# Altium schematic symbol library FPGA_Xilinx_Virtex7.SchLib: 34 symbols (part 4 of 26) (continued)
## XC7V2000T-FLG1925 (continued)
part J pins: AA2 IO_L18N_T2_37, AA3 IO_L18P_T2_37, AA4 IO_L17N_T2_37, AA5 IO_L17P_T2_37, AA6 VCCO_37, AA7 IO_L22N_T3_37, AA8 IO_L22P_T3_37, AA9 IO_L20N_T3_37, AA10 IO_L20P_T3_37, J1 IO_L9N_T1_DQS_38, J2 VCCO_38, J3 IO_L10N_T1_38, J4 IO_L8N_T1_38, J5 IO_L8P_T1_38, K1 IO_L9P_T1_DQS_38, K2 IO_L7N_T1_38, K3 IO_L10P_T1_38, K5 IO_L4N_T0_38, K6 IO_L2N_T0_38, K7 IO_L2P_T0_38, K8 IO_L1N_T0_38, L2 IO_L7P_T1_38, L3 IO_L12N_T1_MRCC_38, L4 IO_L12P_T1_MRCC_38, L5 IO_L4P_T0_38, L6 VCCO_38, L7 IO_L6N_T0_VREF_38, L8 IO_L6P_T0_38, L9 IO_L1P_T0_38, L10 IO_0_VRN_38, M1 IO_L15N_T2_DQS_38, M2 IO_L15P_T2_DQS_38, M3 VCCO_38, M4 IO_L11N_T1_SRCC_38, M5 IO_L11P_T1_SRCC_38, M6 IO_L3N_T0_DQS_38, M7 IO_L3P_T0_DQS_38, M9 IO_L5N_T0_38, M10 IO_L5P_T0_38, N1 IO_L17N_T2_38, N2 IO_L17P_T2_38, N3 IO_L13N_T2_MRCC_38, N4 IO_L13P_T2_MRCC_38, N6 IO_L20N_T3_38, N7 IO_L21N_T3_DQS_38, N8 IO_L19N_T3_VREF_38, N9 IO_L19P_T3_38, N10 VCCO_38, P1 IO_L16N_T2_38, P3 IO_L14N_T2_SRCC_38, P4 IO_L14P_T2_SRCC_38, P5 IO_L22N_T3_38, P6 IO_L20P_T3_38, P7 VCCO_38, P8 IO_L21P_T3_DQS_38, P9 IO_L23N_T3_38, P10 IO_L23P_T3_38, R1 IO_L16P_T2_38, R2 IO_L18N_T2_38, R3 IO_L18P_T2_38, R4 VCCO_38, R5 IO_L22P_T3_38, R6 IO_L24N_T3_38, R7 IO_L24P_T3_38, R8 IO_L2N_T0_37, R10 IO_25_VRP_38, T1 VCCO_37, T2 IO_L10N_T1_37, T3 IO_L10P_T1_37, T4 IO_L8N_T1_37, T5 IO_L8P_T1_37, T7 IO_L4N_T0_37, T8 IO_L4P_T0_37, T9 IO_L2P_T0_37, T10 IO_0_VRN_37, U1 IO_L7N_T1_37, U2 IO_L7P_T1_37, U4 IO_L12N_T1_MRCC_37, U5 IO_L12P_T1_MRCC_37, U6 IO_L1N_T0_37, U7 IO_L1P_T0_37, U8 VCCO_37, U9 IO_L6N_T0_VREF_37, U10 IO_L6P_T0_37, V1 IO_L9N_T1_DQS_37, V2 IO_L9P_T1_DQS_37, V3 IO_L11N_T1_SRCC_37, V4 IO_L11P_T1_SRCC_37, V5 VCCO_37, V6 IO_L21N_T3_DQS_37, V7 IO_L3N_T0_DQS_37, V8 IO_L3P_T0_DQS_37, V9 IO_L5N_T0_37, V10 IO_L5P_T0_37, W1 IO_L16N_T2_37, W2 VCCO_37, W3 IO_L13N_T2_MRCC_37, W4 IO_L13P_T2_MRCC_37, W5 IO_L14N_T2_SRCC_37, W6 IO_L21P_T3_DQS_37, W8 IO_L23N_T3_37, W9 IO_L19N_T3_VREF_37, W10 IO_L19P_T3_37, Y1 IO_L16P_T2_37, Y2 IO_L15N_T2_DQS_37, Y3 IO_L15P_T2_DQS_37, Y5 IO_L14P_T2_SRCC_37, Y6 IO_L24N_T3_37, Y7 IO_L24P_T3_37, Y8 IO_L23P_T3_37, Y9 VCCO_37, Y10 IO_25_VRP_37
part K pins: A3 IO_L18N_T2_39, A4 IO_L16N_T2_39, A5 IO_L16P_T2_39, A6 VCCO_39, A7 IO_L10N_T1_39, A18 IO_L7N_T1_40, A19 IO_L7P_T1_40, A20 IO_L8N_T1_40, B2 IO_L15N_T2_DQS_39, B3 VCCO_39, B4 IO_L18P_T2_39, B5 IO_L9N_T1_DQS_39, B6 IO_L9P_T1_DQS_39, B7 IO_L10P_T1_39, B19 IO_L9N_T1_DQS_40, B20 IO_L8P_T1_40, B21 IO_L10N_T1_40, C1 IO_L17N_T2_39, C2 IO_L15P_T2_DQS_39, C3 IO_L13N_T2_MRCC_39, C4 IO_L14N_T2_SRCC_39, C6 IO_L7N_T1_39, C7 IO_L7P_T1_39, C8 IO_L8N_T1_39, C18 IO_L11N_T1_SRCC_40, C19 IO_L9P_T1_DQS_40, C20 VCCO_40, C21 IO_L10P_T1_40, D1 IO_L17P_T2_39, D3 IO_L13P_T2_MRCC_39, D4 IO_L14P_T2_SRCC_39, D5 IO_L11N_T1_SRCC_39, D6 IO_L12N_T1_MRCC_39, D7 VCCO_39, D8 IO_L8P_T1_39, D18 IO_L11P_T1_SRCC_40, D19 IO_L12N_T1_MRCC_40, D20 IO_L12P_T1_MRCC_40, D21 IO_L15N_T2_DQS_40, E1 IO_L23N_T3_39, E2 IO_L23P_T3_39, E3 IO_L21N_T3_DQS_39, E4 VCCO_39, E5 IO_L11P_T1_SRCC_39, E6 IO_L12P_T1_MRCC_39, E7 IO_L3N_T0_DQS_39, E8 IO_L1N_T0_39, E18 IO_L18N_T2_40, E20 IO_L14N_T2_SRCC_40, E21 IO_L15P_T2_DQS_40, F1 VCCO_39, F2 IO_L22N_T3_39, F3 IO_L21P_T3_DQS_39, F4 IO_L19N_T3_VREF_39, F5 IO_L5N_T0_39, F7 IO_L3P_T0_DQS_39, F8 IO_L1P_T0_39, F18 IO_L18P_T2_40, F19 IO_L13N_T2_MRCC_40, F20 IO_L14P_T2_SRCC_40, F21 VCCO_40, G1 IO_L24N_T3_39, G2 IO_L22P_T3_39, G4 IO_L19P_T3_39, G5 IO_L5P_T0_39, G6 IO_L4N_T0_39, G7 IO_L4P_T0_39, G8 VCCO_39, G18 VCCO_40, G19 IO_L13P_T2_MRCC_40, G20 IO_L17N_T2_40, G21 IO_L17P_T2_40, H1 IO_L24P_T3_39, H2 IO_L20N_T3_39, H3 IO_L20P_T3_39, H4 IO_25_VRP_39, H5 VCCO_39, H6 IO_L6N_T0_VREF_39, H7 IO_L2N_T0_39, H8 IO_L2P_T0_39, H18 IO_L3N_T0_DQS_40, H19 IO_L5N_T0_40, J6 IO_L6P_T0_39, J8 IO_0_VRN_39, J18 IO_L3P_T0_DQS_40, J19 IO_L5P_T0_40, J20 IO_L16N_T2_40, K17 IO_L1N_T0_40, K18 IO_L2N_T0_40, K19 VCCO_40, K20 IO_L16P_T2_40, L17 IO_L1P_T0_40, L18 IO_L2P_T0_40, L19 IO_L6N_T0_VREF_40, L20 IO_L4N_T0_40, M17 IO_0_VRN_40, M19 IO_L6P_T0_40, M20 IO_L4P_T0_40, N17 IO_25_VRP_40, N18 IO_L24N_T3_40, N19 IO_L19N_T3_VREF_40, N20 VCCO_40, P17 VCCO_40, P18 IO_L24P_T3_40, P19 IO_L19P_T3_40, P20 IO_L20N_T3_40, R17 IO_L23N_T3_40, R18 IO_L22N_T3_40, R20 IO_L20P_T3_40, T17 IO_L23P_T3_40, T18 IO_L22P_T3_40, T19 IO_L21N_T3_DQS_40, T20 IO_L21P_T3_DQS_40
part L pins: A8 IO_L7N_T1_42, A9 IO_L10N_T1_42, A10 IO_L10P_T1_42, A12 IO_L8N_T1_42, A13 IO_L8N_T1_41, A14 IO_L10N_T1_41, A15 IO_L10P_T1_41, A16 VCCO_41, A17 IO_L17N_T2_41, B9 IO_L7P_T1_42, B10 IO_L9N_T1_DQS_42, B11 IO_L9P_T1_DQS_42, B12 IO_L8P_T1_42, B13 VCCO_41, B14 IO_L8P_T1_41, B15 IO_L16N_T2_41, B16 IO_L16P_T2_41, B17 IO_L17P_T2_41, C9 IO_L12N_T1_MRCC_42, C10 VCCO_42, C11 IO_L11N_T1_SRCC_42, C12 IO_L11P_T1_SRCC_42, C13 IO_L11N_T1_SRCC_41, C14 IO_L11P_T1_SRCC_41, C16 IO_L18N_T2_41, C17 IO_L18P_T2_41, D9 IO_L12P_T1_MRCC_42, D10 IO_L14N_T2_SRCC_42, D11 IO_L13N_T2_MRCC_42, D13 IO_L9N_T1_DQS_41, D14 IO_L12N_T1_MRCC_41, D15 IO_L12P_T1_MRCC_41, D16 IO_L14N_T2_SRCC_41, D17 VCCO_41, E10 IO_L14P_T2_SRCC_42, E11 IO_L13P_T2_MRCC_42, E12 IO_L15N_T2_DQS_42, E13 IO_L9P_T1_DQS_41, E14 VCCO_41, E15 IO_L13N_T2_MRCC_41, E16 IO_L14P_T2_SRCC_41, E17 IO_L15N_T2_DQS_41, F9 IO_L22N_T3_42, F10 IO_L16N_T2_42, F11 VCCO_42, F12 IO_L15P_T2_DQS_42, F13 IO_L7N_T1_41, F14 IO_L7P_T1_41, F15 IO_L13P_T2_MRCC_41, F17 IO_L15P_T2_DQS_41, G9 IO_L22P_T3_42, G10 IO_L16P_T2_42, G11 IO_L18N_T2_42, G12 IO_L17N_T2_42, G14 IO_L4N_T0_41, G15 IO_L4P_T0_41, G16 IO_L3N_T0_DQS_41, G17 IO_L6N_T0_VREF_41, H9 IO_L24N_T3_42, H11 IO_L18P_T2_42, H12 IO_L17P_T2_42, H13 IO_L19N_T3_VREF_42, H14 IO_L2N_T0_41, H15 VCCO_41, H16 IO_L3P_T0_DQS_41, H17 IO_L6P_T0_41, J9 IO_L24P_T3_42, J10 IO_L20N_T3_42, J11 IO_L23N_T3_42, J12 VCCO_42, J13 IO_L19P_T3_42, J14 IO_L2P_T0_41, J15 IO_L1N_T0_41, J16 IO_L5N_T0_41, K9 VCCO_42, K10 IO_L20P_T3_42, K11 IO_L23P_T3_42, K12 IO_L21N_T3_DQS_42, K13 IO_25_VRP_42, K15 IO_L1P_T0_41, K16 IO_L5P_T0_41, L12 IO_L21P_T3_DQS_42, L13 IO_0_VRN_42, L14 IO_L20N_T3_41, L15 IO_0_VRN_41, L16 VCCO_41, M11 IO_L3N_T0_DQS_42, M12 IO_L5N_T0_42, M13 VCCO_42, M14 IO_L24N_T3_41, M15 IO_L20P_T3_41, M16 IO_L21N_T3_DQS_41, N11 IO_L3P_T0_DQS_42, N12 IO_L5P_T0_42, N13 IO_L1N_T0_42, N14 IO_L24P_T3_41, N16 IO_L21P_T3_DQS_41, P11 IO_L6N_T0_VREF_42, P13 IO_L1P_T0_42, P14 IO_L22N_T3_41, P15 IO_L22P_T3_41, P16 IO_L19N_T3_VREF_41, R11 IO_L6P_T0_42, R12 IO_L4N_T0_42, R13 IO_L2N_T0_42, R14 VCCO_41, R15 IO_L23N_T3_41, R16 IO_L19P_T3_41, T11 VCCO_42, T12 IO_L4P_T0_42, T13 IO_L2P_T0_42, T14 IO_25_VRP_41, T15 IO_L23P_T3_41
part M pins: AP1 MGTXTXN3_113, AP2 MGTXTXP3_113, AP5 MGTXRXN3_113, AP6 MGTXRXP3_113, AR3 MGTXRXN2_113, AR4 MGTXRXP2_113, AR7 MGTREFCLK0N_113, AR8 MGTREFCLK0P_113, AT1 MGTXTXN2_113, AT2 MGTXTXP2_113, AT5 MGTXRXN1_113, AT6 MGTXRXP1_113, AU3 MGTXTXN1_113, AU4 MGTXTXP1_113, AU7 MGTREFCLK1N_113, AU8 MGTREFCLK1P_113, AV1 MGTXTXN0_113, AV2 MGTXTXP0_113, AV5 MGTXRXN0_113, AV6 MGTXRXP0_113, AW3 MGTXRXN3_112, AW4 MGTXRXP3_112, AW7 MGTREFCLK0N_112, AW8 MGTREFCLK0P_112, AY1 MGTXTXN3_112, AY2 MGTXTXP3_112, AY5 MGTXRXN2_112, AY6 MGTXRXP2_112, BA3 MGTXTXN2_112, BA4 MGTXTXP2_112, BA7 MGTREFCLK1N_112, BA8 MGTREFCLK1P_112, BB1 MGTXTXN1_112, BB2 MGTXTXP1_112, BB5 MGTXRXN1_112, BB6 MGTXRXP1_112, BC3 MGTXTXN0_112, BC4 MGTXTXP0_112, BD5 MGTXRXN0_112, BD6 MGTXRXP0_112
part N pins: AD1 MGTXTXN3_115, AD2 MGTXTXP3_115, AD5 MGTXRXN3_115, AD6 MGTXRXP3_115, AE3 MGTXTXN2_115, AE4 MGTXTXP2_115, AE7 MGTXRXN2_115, AE8 MGTXRXP2_115, AF1 MGTXTXN1_115, AF2 MGTXTXP1_115, AF5 MGTXRXN1_115, AF6 MGTXRXP1_115, AG3 MGTXTXN0_115, AG4 MGTXTXP0_115, AG7 MGTREFCLK0N_115, AG8 MGTREFCLK0P_115, AH1 MGTXTXN3_114, AH2 MGTXTXP3_114, AH5 MGTXRXN0_115, AH6 MGTXRXP0_115, AJ3 MGTXRXN3_114, AJ4 MGTXRXP3_114, AJ7 MGTREFCLK1N_115, AJ8 MGTREFCLK1P_115, AK1 MGTXTXN2_114, AK2 MGTXTXP2_114, AK5 MGTXRXN2_114, AK6 MGTXRXP2_114, AL3 MGTXTXN1_114, AL4 MGTXTXP1_114, AL7 MGTREFCLK0N_114, AL8 MGTREFCLK0P_114, AM1 MGTXTXN0_114, AM2 MGTXTXP0_114, AM5 MGTXRXN1_114, AM6 MGTXRXP1_114, AN3 MGTXRXN0_114, AN4 MGTXRXP0_114, AN7 MGTREFCLK1N_114, AN8 MGTREFCLK1P_114
part O pins: AD7 MGTAVCC_G11, AE5 MGTAVTT_G11, AF3 MGTAVTT_G11, AF8 MGTAVCC_G11, AF9 MGTRREF_115, AF10 MGTAVTTRCAL_115, AH8 MGTAVCC_G11, AJ5 MGTAVTT_G11, AK3 MGTAVTT_G11, AK8 MGTAVCC_G11, AM8 MGTVCCAUX_G11, AN5 MGTAVTT_G11, AP3 MGTAVTT_G10, AP8 MGTVCCAUX_G10, AT8 MGTAVCC_G10, AU5 MGTAVTT_G10, AV3 MGTAVTT_G10, AV8 MGTAVCC_G10, AY8 MGTAVCC_G10, BA5 MGTAVTT_G10, BB3 MGTAVTT_G10, BB8 MGTAVCC_G10, BC7 MGTRREF_112, BC8 MGTAVTTRCAL_112
part P pins: AB2 CCLK_0, AB3 INIT_B_0, AB4 TDI_0, AB5 TCK_0, AB6 TMS_0, AB7 TDO_0, AB9 VCCO_0, AB10 PROGRAM_B_0, AB20 VREFN_0, AB21 VP_0, AC8 VCCO_0, AC10 CFGBVS_0, AC20 VN_0, AC21 VREFP_0, AD10 DONE_0, AD20 DXN_0, AD21 DXP_0, AG10 M2_0, AG11 M1_0, AH11 M0_0
part Q pins: A11 GND, A21 GND, A31 GND, A41 GND, AA12 VCCINT, AA14 VCCINT, AA16 VCCAUX_IO_G6, AA18 VCCINT, AA20 GNDADC, AA21 VCCADC, AA22 VCCBRAM, AA24 VCCINT, AA26 VCCAUX_IO_G2, AA28 VCCAUX, AB1 VCCBATT_0, AB11 VCCINT, AB13 VCCINT, AB15 VCCAUX, AB17 VCCAUX_IO_G6, AB19 VCCINT, AB23 VCCINT, AB25 VCCINT, AB27 VCCAUX_IO_G2, AC12 VCCINT, AC14 VCCINT, AC16 VCCAUX_IO_G5, AC18 VCCINT, AC22 VCCBRAM, AC24 VCCINT, AC26 VCCAUX_IO_G1, AC28 VCCAUX, AD11 VCCINT, AD13 VCCINT, AD15 VCCAUX, AD17 VCCAUX_IO_G5, AD19 VCCINT, AD23 VCCINT, AD25 VCCINT, AD27 VCCAUX_IO_G1, AE12 VCCINT, AE14 VCCINT, AE16 VCCAUX_IO_G5, AE18 VCCINT, AE20 VCCINT, AE22 VCCBRAM, AE24 VCCINT, AE26 VCCAUX_IO_G1, AE28 VCCAUX, AF11 VCCINT, AF13 VCCINT, AF15 VCCAUX, AF17 VCCAUX_IO_G4, AF19 VCCINT, AF21 VCCBRAM, AF23 VCCINT, AF25 VCCINT, AF27 VCCAUX_IO_G0, AG12 VCCINT, AG14 VCCINT, AG16 VCCAUX_IO_G4, AG18 VCCINT, AG20 VCCINT, AG22 VCCBRAM, AG24 VCCINT, AG26 VCCAUX_IO_G0, AG28 VCCAUX, AH13 VCCINT, AH15 VCCAUX, AH17 VCCAUX_IO_G4, AH19 VCCINT, AH21 VCCBRAM, AH23 VCCINT, AH25 VCCINT, AH27 VCCAUX_IO_G0, B8 GND, B18 GND, B28 GND, B38 GND, C5 GND, C15 GND, C25 GND, C35 GND, D2 GND, D12 GND, D22 GND, D32 GND, D42 GND, E9 GND, E19 GND, E29 GND, E39 GND, F6 GND, F16 GND, F26 GND, F36 GND, G3 GND, G13 GND, G23 GND, G33 GND, G43 GND, H10 GND, H20 GND, H30 GND, H40 GND, J7 GND, J17 GND, J27 GND, J37 GND, K4 GND, K14 GND, K24 GND, K34 GND, K44 GND, L1 GND, L11 GND, L21 GND, L31 GND, L41 GND, M8 GND, M18 GND, M28 GND, M38 GND, N5 GND, N15 GND, N25 GND, N35 GND, P2 GND, P12 GND, P22 GND, P32 GND, P42 GND, R9 GND, R19 GND, R29 GND, R39 GND, T6 GND, T16 GND, T26 GND, T36 GND, U3 GND, U11 GND, U12 VCCINT, U13 GND, U14 VCCINT, U15 GND, U16 VCCAUX_IO_G7, U17 GND, U18 VCCINT, U19 GND, U20 VCCINT, U21 GND, U22 VCCBRAM, U23 GND, U24 VCCINT, U25 GND, U26 VCCAUX_IO_G3, U27 GND, U28 VCCAUX, U33 GND, U43 GND, V11 VCCINT, V12 GND, V13 VCCINT, V14 GND, V15 VCCAUX, V16 GND, V17 VCCAUX_IO_G7, V18 GND, V19 VCCINT, V20 GND, V21 VCCBRAM, V22 GND, V23 VCCINT, V24 GND, V25 VCCINT, V26 GND, V27 VCCAUX_IO_G3, V28 GND, V30 GND, V40 GND, W7 GND, W11 GND, W12 VCCINT, W13 GND, W14 VCCINT, W15 GND, W16 VCCAUX_IO_G7, W17 GND, W18 VCCINT, W19 GND, W20 VCCINT, W21 GND, W22 VCCBRAM, W23 GND, W24 VCCINT, W26 VCCAUX_IO_G3, W28 VCCAUX, Y11 VCCINT, Y13 VCCINT, Y15 VCCAUX, Y17 VCCAUX_IO_G6, Y19 VCCINT, Y21 VCCBRAM, Y23 VCCINT, Y25 VCCINT, Y27 VCCAUX_IO_G2
part R pins: AA1 GND, AA11 GND, AA13 GND, AA15 GND, AA17 GND, AA19 GND, AA23 GND, AA25 GND, AA27 GND, AA31 GND, AA41 GND, AB8 GND, AB12 GND, AB14 GND, AB16 GND, AB18 GND, AB22 GND, AB24 GND, AB26 GND, AB38 GND, AC1 GND, AC2 GND, AC3 GND, AC4 GND, AC5 GND, AC6 GND, AC7 GND, AC9 GND, AC11 GND, AC13 GND, AC15 GND, AC17 GND, AC19 GND, AC23 GND, AC25 GND, AC27 GND, AC35 GND, AD3 GND, AD4 GND, AD8 GND, AD9 GND, AD12 GND, AD14 GND, AD16 GND, AD18 GND, AD22 GND, AD24 GND, AD26 GND, AD28 GND, AD32 GND, AD42 GND, AE1 GND, AE2 GND, AE6 GND, AE9 GND, AE10 GND, AE11 GND, AE13 GND, AE15 GND, AE17 GND, AE19 GND, AE21 GND, AE23 GND, AE25 GND, AE27 GND, AE29 GND, AE39 GND, AF4 GND, AF7 GND, AF12 GND, AF14 GND, AF16 GND, AF18 GND, AF20 GND, AF22 GND, AF24 GND, AF26 GND, AF28 GND, AF36 GND, AG1 GND, AG2 GND, AG5 GND, AG6 GND, AG9 GND, AG13 GND, AG15 GND, AG17 GND, AG19 GND, AG21 GND, AG23 GND, AG25 GND, AG27 GND, AG33 GND, AG43 GND, AH3 GND, AH4 GND, AH7 GND, AH9 GND, AH10 GND, AH12 GND, AH14 GND, AH16 GND, AH18 GND, AH20 GND, AH22 GND, AH24 GND, AH26 GND, AH30 GND, AH40 GND, AJ1 GND, AJ2 GND, AJ6 GND, AJ9 GND, AJ17 GND, AJ27 GND, AJ37 GND, AK4 GND, AK7 GND, AK9 GND, AK14 GND, AK24 GND, AK34 GND, AK44 GND, AL1 GND, AL2 GND, AL5 GND, AL6 GND, AL9 GND, AL11 GND, AL21 GND, AL31 GND, AL41 GND, AM3 GND, AM4 GND, AM7 GND, AM9 GND, AM18 GND, AM28 GND, AM38 GND, AN1 GND, AN2 GND, AN6 GND, AN9 GND, AN15 GND, AN25 GND, AN35 GND, AP4 GND, AP7 GND, AP9 GND, AP12 GND, AP22 GND, AP32 GND, AP42 GND, AR1 GND, AR2 GND, AR5 GND, AR6 GND, AR9 GND, AR19 GND, AR29 GND, AR39 GND, AT3 GND, AT4 GND, AT7 GND, AT9 GND, AT16 GND, AT26 GND, AT36 GND, AU1 GND, AU2 GND, AU6 GND, AU9 GND, AU13 GND, AU23 GND, AU33 GND, AU43 GND, AV4 GND, AV7 GND, AV9 GND, AV10 GND, AV20 GND, AV30 GND, AV40 GND, AW1 GND, AW2 GND, AW5 GND, AW6 GND, AW9 GND, AW17 GND, AW27 GND, AW37 GND, AY3 GND, AY4 GND, AY7 GND, AY9 GND, AY14 GND, AY24 GND, AY34 GND, AY44 GND, BA1 GND, BA2 GND, BA6 GND, BA9 GND, BA11 GND, BA21 GND, BA31 GND, BA41 GND, BB4 GND, BB7 GND, BB9 GND, BB18 GND, BB28 GND, BB38 GND, BC2 GND, BC5 GND, BC6 GND, BC9 GND, BC15 GND, BC25 GND, BC35 GND, BD3 GND, BD4 GND, BD7 GND, BD8 GND, BD9 GND, BD12 GND, BD22 GND, BD32 GND, BD42 GND, W25 GND, W27 GND, W37 GND, Y4 GND, Y12 GND, Y14 GND, Y16 GND, Y18 GND, Y20 GND, Y22 GND, Y24 GND, Y26 GND, Y28 GND, Y34 GND, Y44 GND

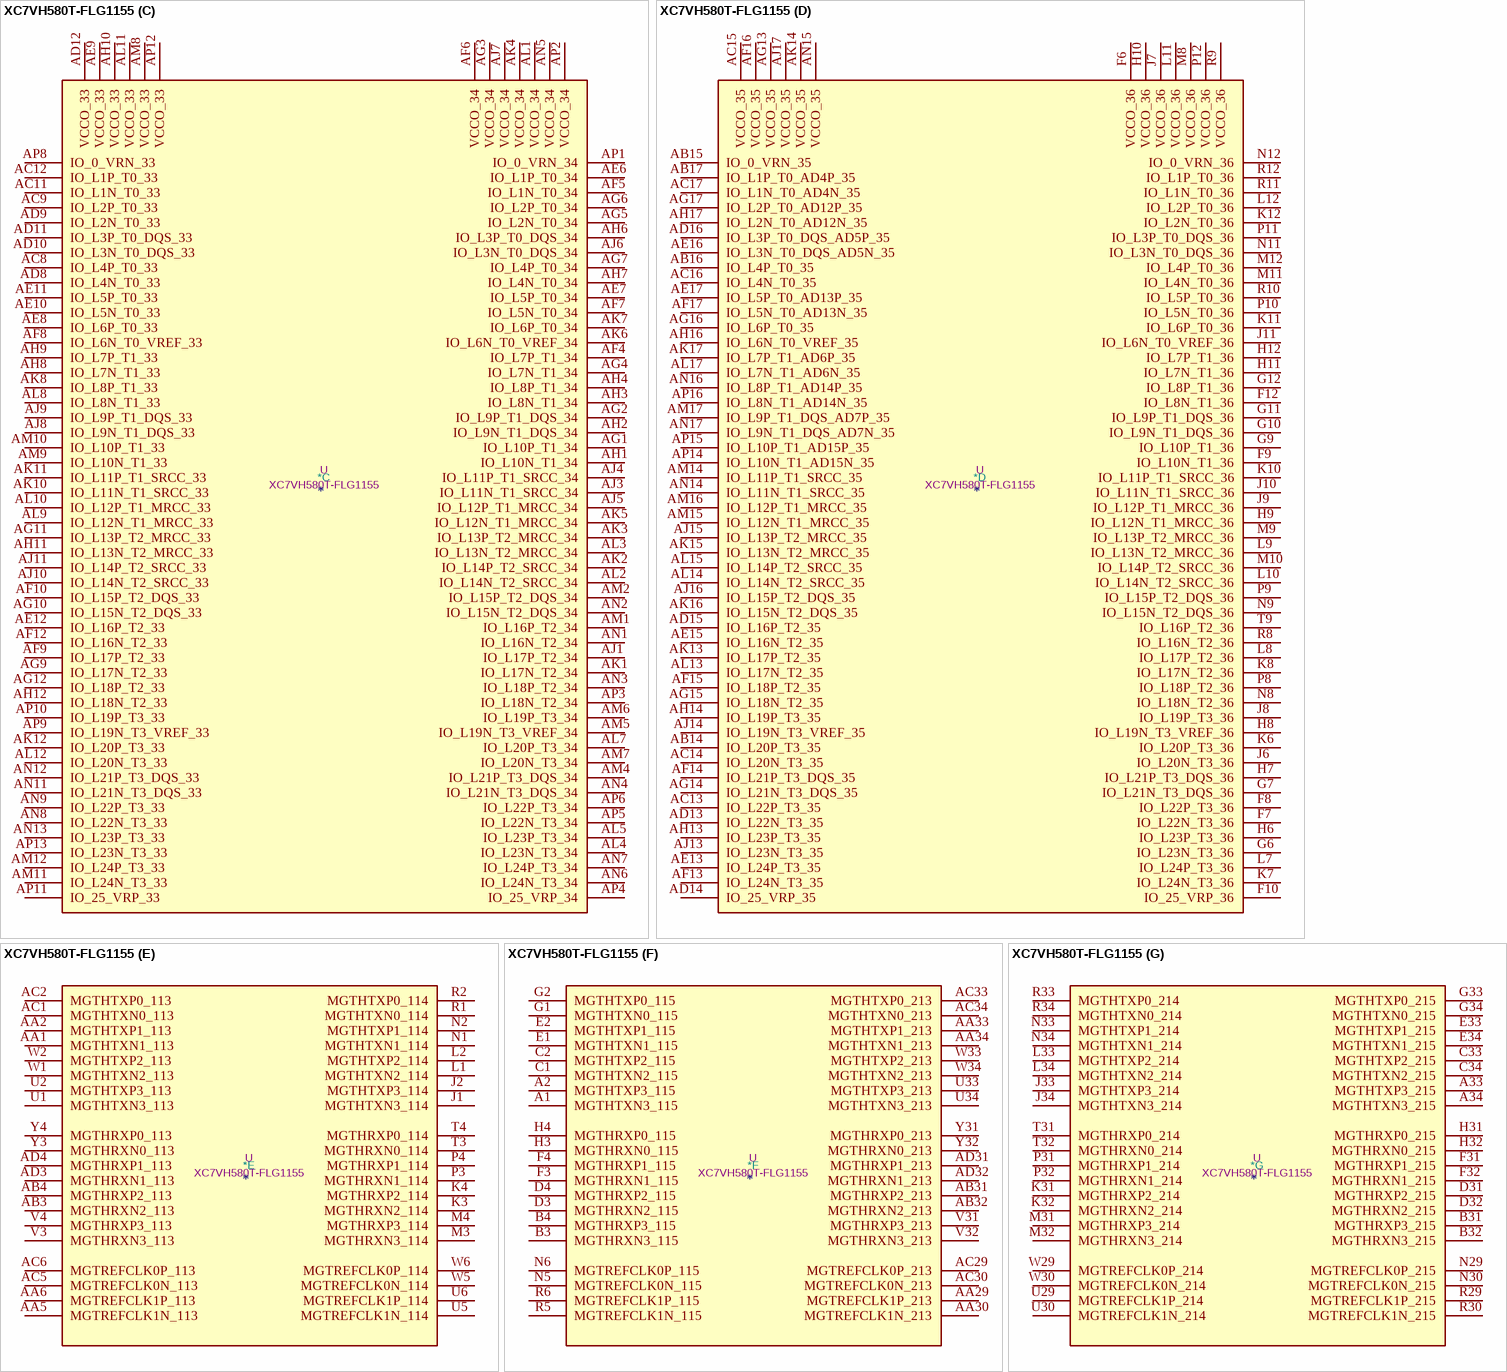
[diagram p24: symbol XC7VH580T-FLG1155]

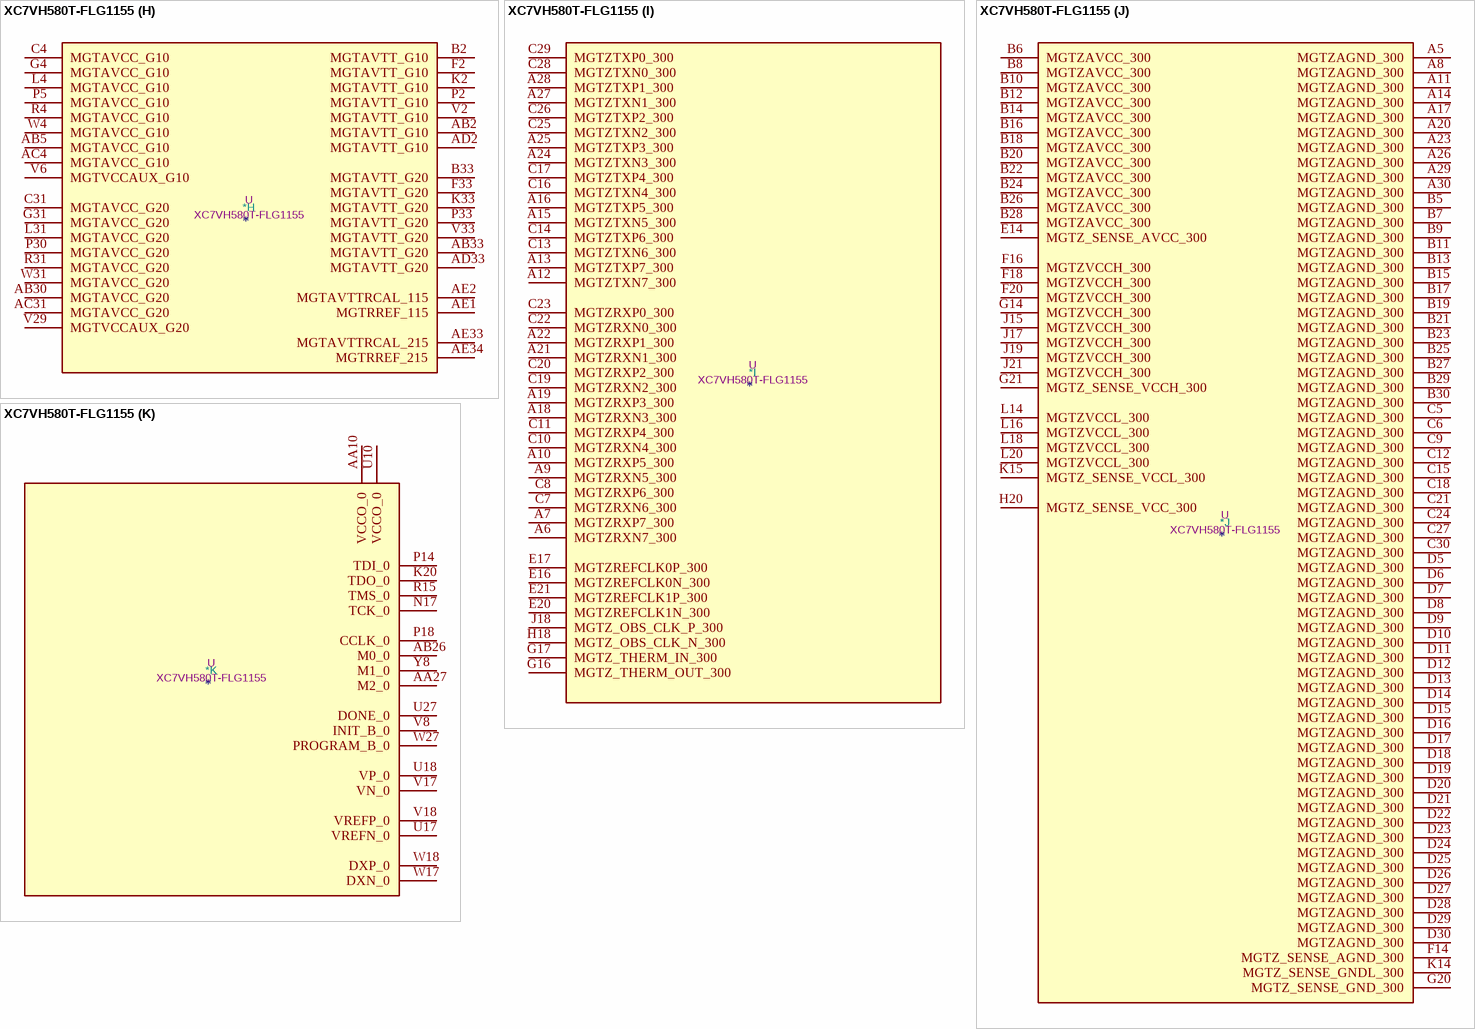
[diagram p25: symbol XC7VH580T-FLG1155]

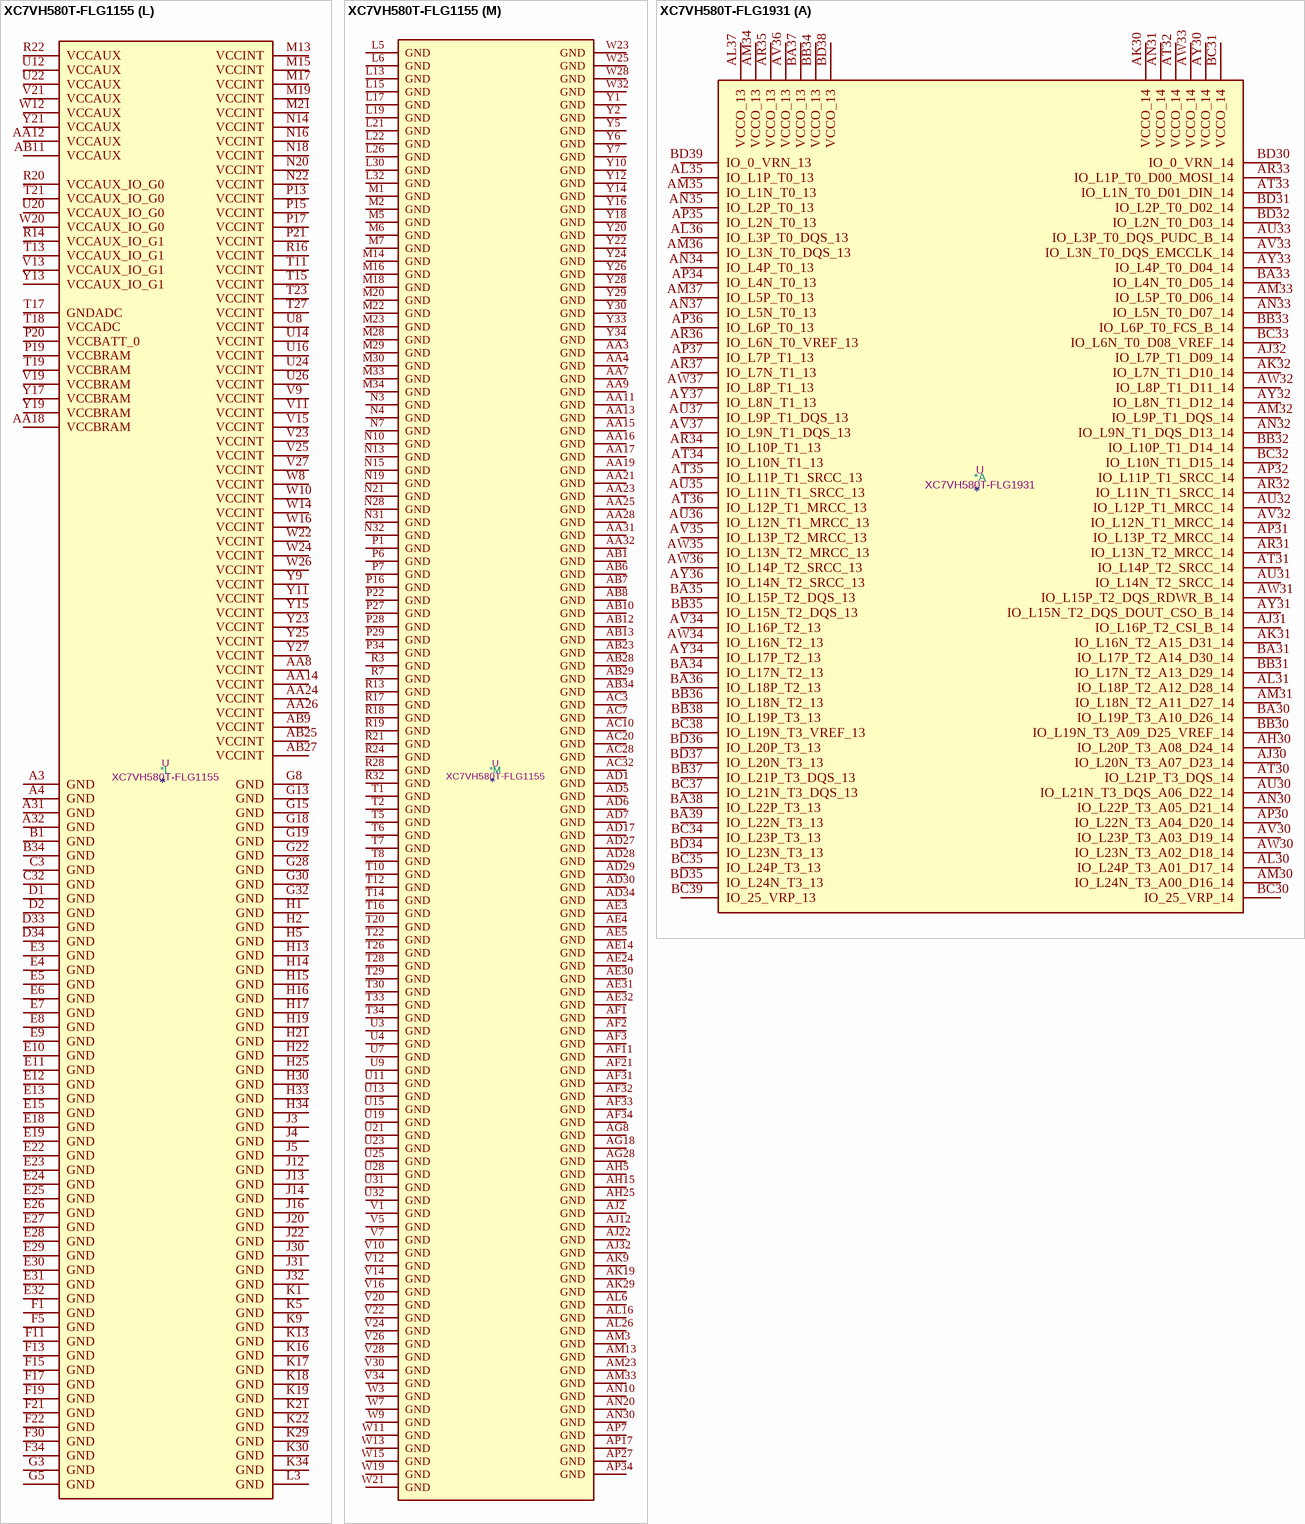
[diagram p26: symbols XC7VH580T-FLG1155 to XC7VH580T-FLG1931]